# Altium footprint library Custom2.PcbLib: 99 footprints (part 3 of 7)
Each footprint in its own frame and in the unit in brackets; x right, y up, seen from the top. Pads: shape width x height; smd on the part's side, far side on the other; paste and mask are expansions set on the pad; w line width, h text height; cw(c..) or ccw(c..) is an arc to the next point about the centre after c.
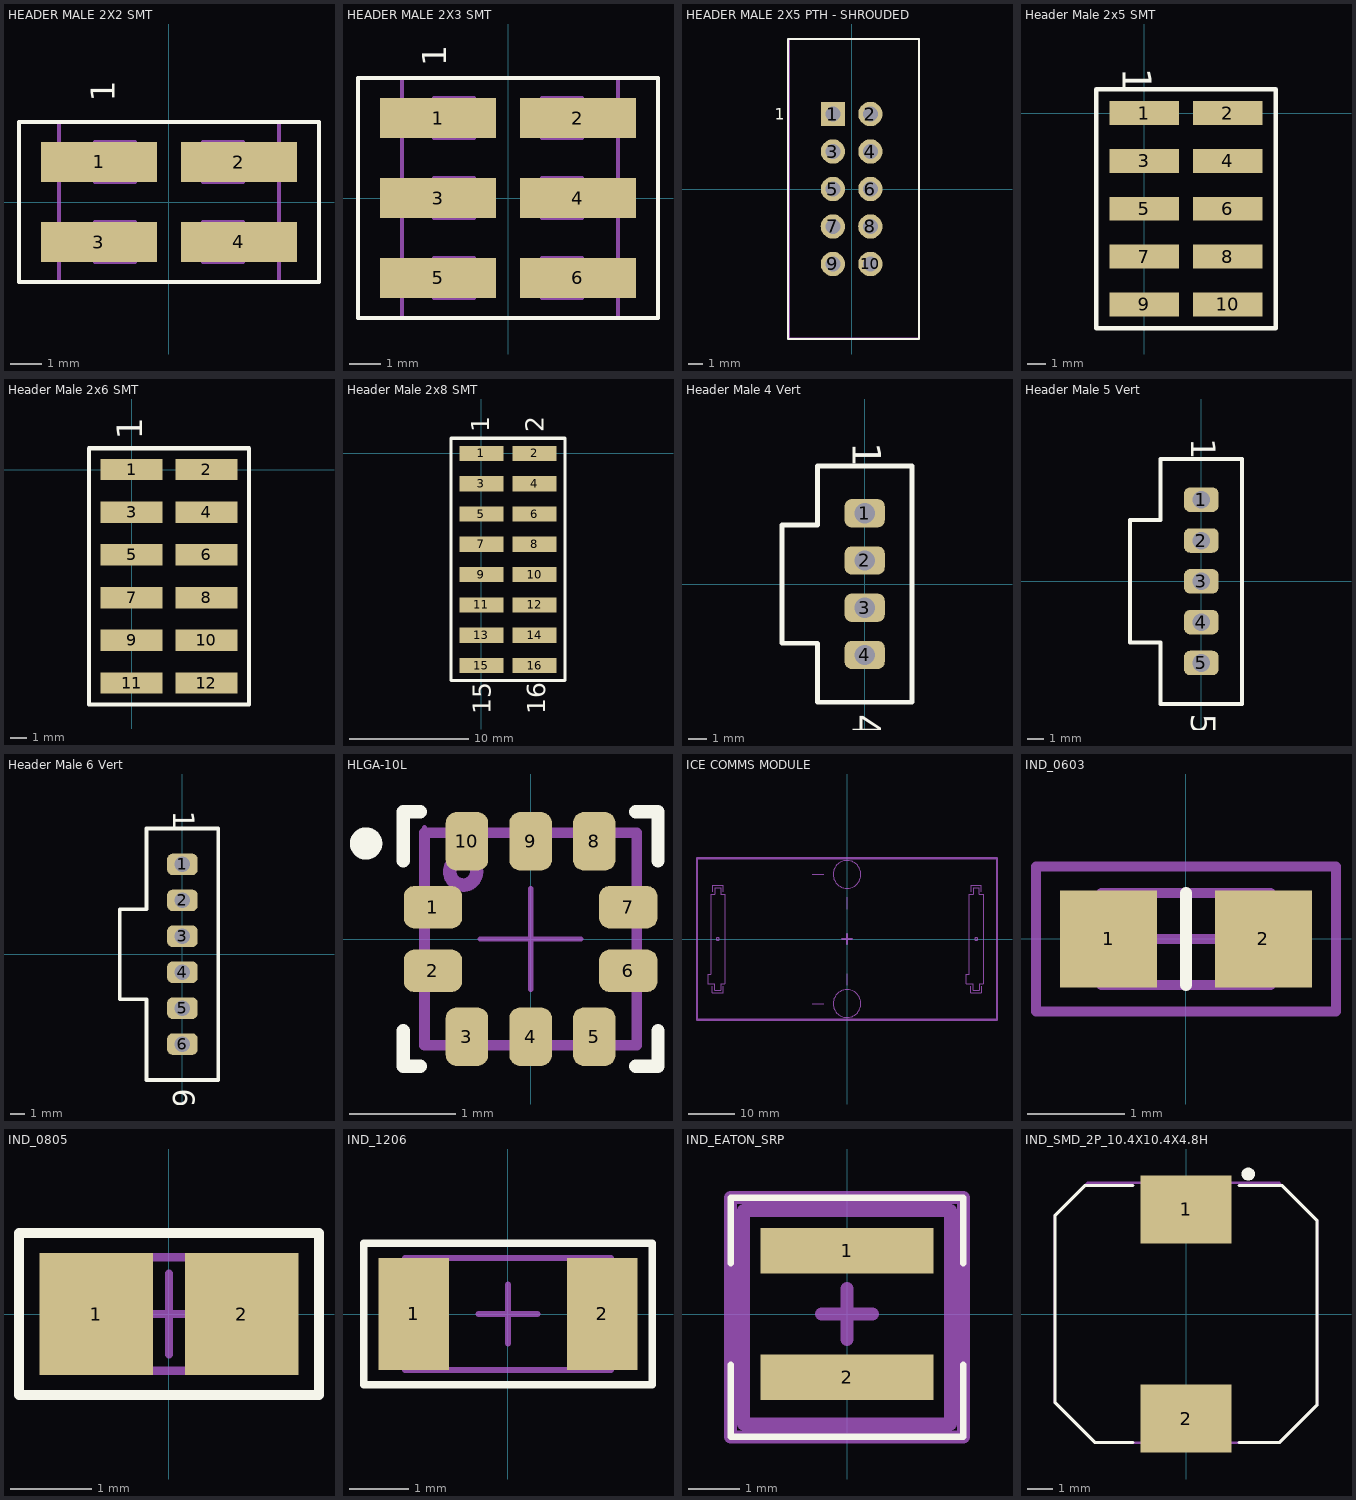
[diagram p2: the footprints below, top view; thin cyan lines are the x and y axes]

## HEADER MALE 2X2 SMT [mil]
pads (4):
  rect 145x50 smd: 1(-87.5,50) 2(87.5,50) 3(-87.5,-50) 4(87.5,-50)
Top Overlay:
  lines w5: -187.5,-100 187.5,-100 187.5,100 -187.5,100 -187.5,-100
  text "1" at -67.5,125 h30
Mechanical 13:
  lines w5: -137.5,-100 137.5,-100 137.5,100 -137.5,100 -137.5,-100 ; -92.5,-75 -92.5,-25 -42.5,-25 -42.5,-75 -92.5,-75 ; -92.5,25 -42.5,25 -42.5,75 -92.5,75 -92.5,25 ; 42.5,-75 42.5,-25 92.5,-25 92.5,-75 42.5,-75 ; 42.5,25 42.5,75 92.5,75 92.5,25 42.5,25
  text "'.Designator'" at -159,-45 h30
  text "1" at -62.5,110 h30
3D body "015910040.stp": height 380.5, standoff 0.5, extent -137.5,-100 137.5,100

## HEADER MALE 2X3 SMT [mil]
pads (6):
  rect 145x50 smd: 1(-87.5,100) 2(87.5,100) 3(-87.5,0) 4(87.5,0) 5(-87.5,-100) 6(87.5,-100)
Top Overlay:
  lines w5: -187.5,-150 -187.5,150 187.5,150 187.5,-150 -187.5,-150
  text "1" at -77.5,165 h30
Mechanical 13:
  lines w5: -132.5,-150 137.5,-150 137.5,150 -132.5,150 -132.5,-150 ; -92.5,-125 -92.5,-75 -42.5,-75 -42.5,-125 -92.5,-125 ; -92.5,-25 -42.5,-25 -42.5,25 -92.5,25 -92.5,-25 ; -92.5,75 -92.5,125 -42.5,125 -42.5,75 -92.5,75 ; 42.5,-125 42.5,-75 92.5,-75 92.5,-125 42.5,-125 ; 42.5,-25 92.5,-25 92.5,25 42.5,25 42.5,-25 ; 42.5,75 92.5,75 92.5,125 42.5,125 42.5,75
  text "1" at -72.5,160 h30
  text "'.Designator'" at -37.5,155 h30
3D body "015910060.stp": height 380.5, standoff 0.5, extent -135,-149.99 140,150.01

## HEADER MALE 2X5 PTH - SHROUDED [mil]
pads (10):
  rect 65x65 hole 40: 1(-50,200)
  round 65 hole 40: 2(50,200) 3(-50,100) 4(50,100) 5(-50,0) 6(50,0) 7(-50,-100) 8(50,-100) 9(-50,-200) 10(50,-200)
Top Overlay:
  lines w5: -170,-400 180,-400 180,400 -170,400 -170,-400
  text "1" at -205,185 h30
Mechanical 13:
  lines w5: -167,-399 -167,400 180,400 180,-399 -167,-399
  text ".designator" at 43.83,137.43 h30
3D body "30310-6002.stp": height 350, standoff -125, extent -167,-399 180,400

## Header Male 2x5 SMT [mil]
pads (10):
  rect 145x50 smd: 1(0,0) 2(175,0) 3(0,-100) 4(175,-100) 5(0,-200) 6(175,-200) 7(0,-300) 8(175,-300) 9(0,-400) 10(175,-400)
Top Overlay:
  lines w10: -100,-450 275,-450 275,50 -100,50 -100,-450
  text "1" at -45,95 h60
3D body "015910100.stp": height 380.5, standoff 0.5, extent -50,-450 225,50

## Header Male 2x6 SMT [mil]
height 230
pads (12):
  rect 145x50 smd: 1(0,0) 2(175,0) 3(0,-100) 4(175,-100) 5(0,-200) 6(175,-200) 7(0,-300) 8(175,-300) 9(0,-400) 10(175,-400) 11(0,-500) 12(175,-500)
Top Overlay:
  lines w10: -100,-550 275,-550 275,50 -100,50 -100,-550
  text "1" at 25,70 h60
3D body "015910120.stp": height 380.5, standoff 0.5, extent -50,-550 225,50

## Header Male 2x8 SMT [mil]
height 230
pads (16):
  rect 145x50 smd: 1(0,0) 2(175,0) 3(0,-100) 4(175,-100) 5(0,-200) 6(175,-200) 7(0,-300) 8(175,-300) 9(0,-400) 10(175,-400) 11(0,-500) 12(175,-500) 13(0,-600) 14(175,-600) 15(0,-700) 16(175,-700)
Top Overlay:
  lines w10: -100,-750 275,-750 275,50 -100,50 -100,-750
  text "1" at 25,70 h60
  text "2" at 205,70 h60
  text "15" at 30,-860 h60
  text "16" at 210,-860 h60
3D body "95278-101A16LF.stp": height 404.04, standoff 0.5, extent -53.7,-750 233.7,50

## Header Male 4 Vert [mil]
height 275
pads (4):
  rrect50% 85x60 hole 43: 1(0,150) 2(0,50) 3(0,-50) 4(0,-150)
Top Overlay:
  lines w10: -175,-125 -175,125 -100,125 -100,250 100,250 100,-250 -100,-250 -100,-125 -175,-125
  text "1" at -25,300 h60
  text "4" at -25,-275 h60
3D body "705430108.stp": height 465.5, standoff -129.5, extent -160,-250 100,250

## Header Male 5 Vert [mil]
height 275
pads (5):
  rrect50% 85x60 hole 43: 1(0,200) 2(0,100) 3(0,0) 4(0,-100) 5(0,-200)
Top Overlay:
  lines w10: -175,-150 -100,-150 -100,-300 100,-300 100,300 -100,300 -100,150 -175,150 -175,-150
  text "5" at -25,-325 h60
  text "1" at -25,350 h60
3D body "705430109.stp": height 465.5, standoff -129.5, extent -160,-300 100,300

## Header Male 6 Vert [mil]
height 275
pads (6):
  rrect50% 85x60 hole 43: 1(0,250) 2(0,150) 3(0,50) 4(0,-50) 5(0,-150) 6(0,-250)
Top Overlay:
  lines w10: -175,-125 -100,-125 -100,-350 100,-350 100,350 -100,350 -100,125 -175,125 -175,-125
  text "6" at -25,-375 h60
  text "1" at -25,400 h60
3D body "705430110.stp": height 465.5, standoff -129.5, extent -160,-350 100,350

## HLGA-10L [mm]
pads (10):
  rrect50% 0.55x0.4 smd mask+0.05: 1(-0.92,0.3) 2(-0.92,-0.3) 6(0.92,-0.3) 7(0.92,0.3)
  rrect50% 0.4x0.55 smd mask+0.05: 3(-0.6,-0.92) 4(0,-0.92) 5(0.6,-0.92) 8(0.6,0.92) 9(0,0.92) 10(-0.6,0.92)
Top Overlay:
  circle w0.152: c-1.55,0.9 r0.076
  lines w0.127: -1.2,-0.864 -1.2,-1.2 -1.041,-1.2 ; -1.2,0.737 -1.2,1.2 -1.041,1.2 ; 0.991,-1.2 1.2,-1.2 1.2,-0.864 ; 0.991,1.2 1.2,1.2 1.2,0.737
Mechanical 13:
  circle w0.127: c-0.635,0.635 r0.127
  lines w0.1: -1,-1 1,-1 1,1 -1,1 -1,-1
  text "'.Designator'" at -1.27,0.889 h0.76
Mechanical 15:
  lines w0.05: -1,1 1,1 1,-1 -1,-1 -1,1.05 ; -0.475,0 0.475,0 ; 0,-0.475 0,0.475
3D body: height 0.86, standoff 0.84, extent -0.786,0.483 -0.482,0.787
3D body: height 0.85, standoff 0, extent -1.02,-1 0.98,1

## ICE COMMS MODULE [mm]
Mechanical 13:
  circle w0.254: c-27.998,-0.001 r0.316
  circle w0.254: c28.002,-0.001 r0.316
  circle w0.254: c0,14 r3
  circle w0.254: c0,-14 r3
  lines w0.254: -29.148,-10.212 -29.148,-11.609 -26.862,-11.609 -26.862,-10.212 ; -29.148,10.235 -29.148,11.632 -26.862,11.632 -26.862,10.235 ; -7.5,-14 -5,-14 ; -7.5,14 -5,14 ; 0,-10 0,-7.5 ; 0,6.5 0,9 ; 26.852,-10.212 26.852,-11.609 29.138,-11.609 29.138,-10.212 ; 26.852,10.235 26.852,11.632 29.138,11.632 29.138,10.235 ; -30.165,-9.703 -28.641,-9.703 -28.641,-11.1 -27.371,-11.1 -27.371,-9.703 -26.482,-9.703 -26.482,9.728 -27.371,9.728 -27.371,11.125 -28.641,11.125 -28.641,9.728 -29.53,9.728 -29.53,-7.671 -30.165,-7.671 -30.165,-9.703 ; 25.835,-9.703 27.359,-9.703 27.359,-11.1 28.629,-11.1 28.629,-9.703 29.518,-9.703 29.518,9.728 28.629,9.728 28.629,11.125 27.359,11.125 27.359,9.728 26.47,9.728 26.47,-7.671 25.835,-7.671 25.835,-9.703
  lines w0.5: -1,0 1,0 ; 0,-1 0,1 ; -32.5,-17.5 -32.5,17.5 -32.5,17.5 ; -32.5,-17.5 32.5,-17.5 ; -32.5,-17.5 -32.5,17.5 ; -32.5,-17.5 32.5,-17.5 ; -32.5,17.5 32.5,17.5 ; -32.5,17.5 32.5,17.5 ; 32.5,-17.5 32.5,17.5 ; 32.5,-17.5 32.5,17.5
  text "Keystone 4883" at 5,-13.5 h1.52
  text "Keystone 4883" at 4,14.5 h1.52
  text "SFM-115-X2-XXX-D-A" at 20.5,-6 h1.52
  text "SFM-115-X2-XXX-D-A" at -22.75,-6.75 h1.52
  text "ICM-MH2" at 5,-16 h1.52
  text "ICM-MH1" at 4,12 h1.52
  text "ICM-J2" at 23,-3.5 h1.52
  text "ICM-J1" at -20.25,-3.5 h1.52
  text "1" at -24.25,10.25 h1.52
  text "1" at 31.75,10.25 h1.52
3D body "Ice Comms Module.step": height 14.37, standoff 0.47, extent -32.5,-17.5 32.5,19.203

## IND_0603 [mm]
pads (2):
  rect 1x1 smd: 1(-0.8,0) 2(0.8,0)
Top Overlay:
  lines w0.127: 0,-0.475 0,0.475
Mechanical 13:
  lines w0.1: -0.875,-0.475 0.875,-0.475 0.875,0.475 -0.875,0.475 -0.875,-0.475
  text "'.Designator'" at -2.515,-0.483 h0.76
Mechanical 15:
  lines w0.1: -0.475,0 0.475,0 ; 0,-0.475 0,0.475 ; -1.55,-0.75 1.55,-0.75 1.55,0.75 -1.55,0.75 -1.55,-0.75
3D body: height 0.91, standoff 0, extent -0.94,-0.432 -0.686,0.432
3D body: height 0.91, standoff 0, extent -0.686,-0.432 0.686,0.432
3D body: height 0.91, standoff 0, extent 0.686,-0.432 0.94,0.432

## IND_0805 [mm]
pads (2):
  rect 1.4x1.5 smd: 1(-0.9,0) 2(0.9,0)
Top Overlay:
  lines w0.127: -1.85,-1 -1.85,1 1.85,1 1.85,-1 -1.85,-1
Mechanical 13:
  lines w0.1: -1.1,-0.7 -1.1,0.7 1.1,0.7 1.1,-0.7 -1.1,-0.7
  text "'.Designator'" at 3.962,0.66 h0.76
Mechanical 15:
  lines w0.1: -0.5,0 0.5,0 ; 0,-0.5 0,0.5 ; -1.85,-1 -1.85,1 1.85,1 1.85,-1 -1.85,-1
3D body: height 1.27, standoff 0, extent 0.762,-0.635 1.016,0.635
3D body: height 1.27, standoff 0, extent -1.016,-0.635 -0.762,0.635
3D body: height 1.27, standoff 0, extent -0.762,-0.635 0.762,0.635

## IND_1206 [mm]
pads (2):
  rect 1.2x1.9 smd: 1(-1.6,0) 2(1.6,0)
Top Overlay:
  lines w0.127: -2.45,-1.2 -2.45,1.2 2.45,1.2 2.45,-1.2 -2.45,-1.2
Mechanical 13:
  lines w0.1: -1.75,-0.95 1.75,-0.95 1.75,0.95 -1.75,0.95 -1.75,-0.95
  text "'.Designator'" at -1.023,-0.56 h0.76
Mechanical 15:
  lines w0.1: -0.5,0 0.5,0 ; 0,-0.5 0,0.5 ; -2.45,-1.2 2.45,-1.2 2.45,1.2 -2.45,1.2 -2.45,-1.2
3D body: height 1.02, standoff 0, extent 0.991,-0.787 1.524,0.787
3D body: height 1.02, standoff 0, extent -1.575,-0.787 -1.041,0.787
3D body: height 1.02, standoff 0.03, extent -1.041,-0.787 0.991,0.787

## IND_EATON_SRP [mil] "IND_EATON_SRP"
height 83
pads (2):
  rect 134x35 smd: 1(0,49) 2(0,-49)
Top Overlay:
  lines w5: -90,-39.37 -90,-95 90,-95 90,-39.37 ; -90,39.37 -90,90 90,90 90,39.37
Mechanical 13:
  lines w10: -80,-85 80,-85 80,80 -80,80 -80,-85
  text "'.Designator'" at -65.25,-29.53 h30
Mechanical 15:
  lines w10: -19.68,0 19.68,0 ; 0,-19.68 0,19.68 ; -90,-95 -90,90 90,90 90,-95 -90,-95
3D body: height 110.24, standoff 0, extent -85,-90 85,85

## IND_SMD_2P_10.4X10.4X4.8H [mm]
pads (2):
  rect 3.6x2.7 smd paste-0.05 mask+0.05: 1(0,4.15) 2(0,-4.15)
Top Overlay:
  region: 2.724,5.55 2.724,5.6 2.685,5.694 2.614,5.765 2.52,5.804 2.47,5.804 2.419,5.804 2.326,5.765 2.254,5.694 2.216,5.6 2.216,5.55 2.216,5.499 2.254,5.406 2.326,5.334 2.419,5.296 2.47,5.296 2.52,5.296 2.614,5.334 2.685,5.406 2.724,5.499
  lines w0.127: -2.1,-5.1 -3.6,-5.1 -5.2,-3.5 -5.2,3.9 -4,5.1 -2.1,5.1 ; 2.1,-5.1 3.7,-5.1 5.2,-3.6 5.2,1.675 5.2,3.7 3.8,5.1 2.1,5.1
Mechanical 13:
  lines w0.1: -5.2,-3.5 -5.2,3.9 -3.9,5.2 3.7,5.2 5.2,3.7 5.2,-3.6 3.7,-5.1 -3.6,-5.1 -5.2,-3.5
  text "'.Designator'" at -3.193,-0.802 h0.76
3D body: height 4.83, standoff 0.03, extent -5.2,-5.1 5.2,5.2